# Altium footprint library con-amp.PCBLIB: 295 footprints (part 15 of 19)
Each footprint in its own frame and in the unit in brackets; x right, y up, seen from the top. Pads: shape width x height; smd on the part's side, far side on the other; paste and mask are expansions set on the pad; w line width, h text height; cw(c..) or ccw(c..) is an arc to the next point about the centre after c.
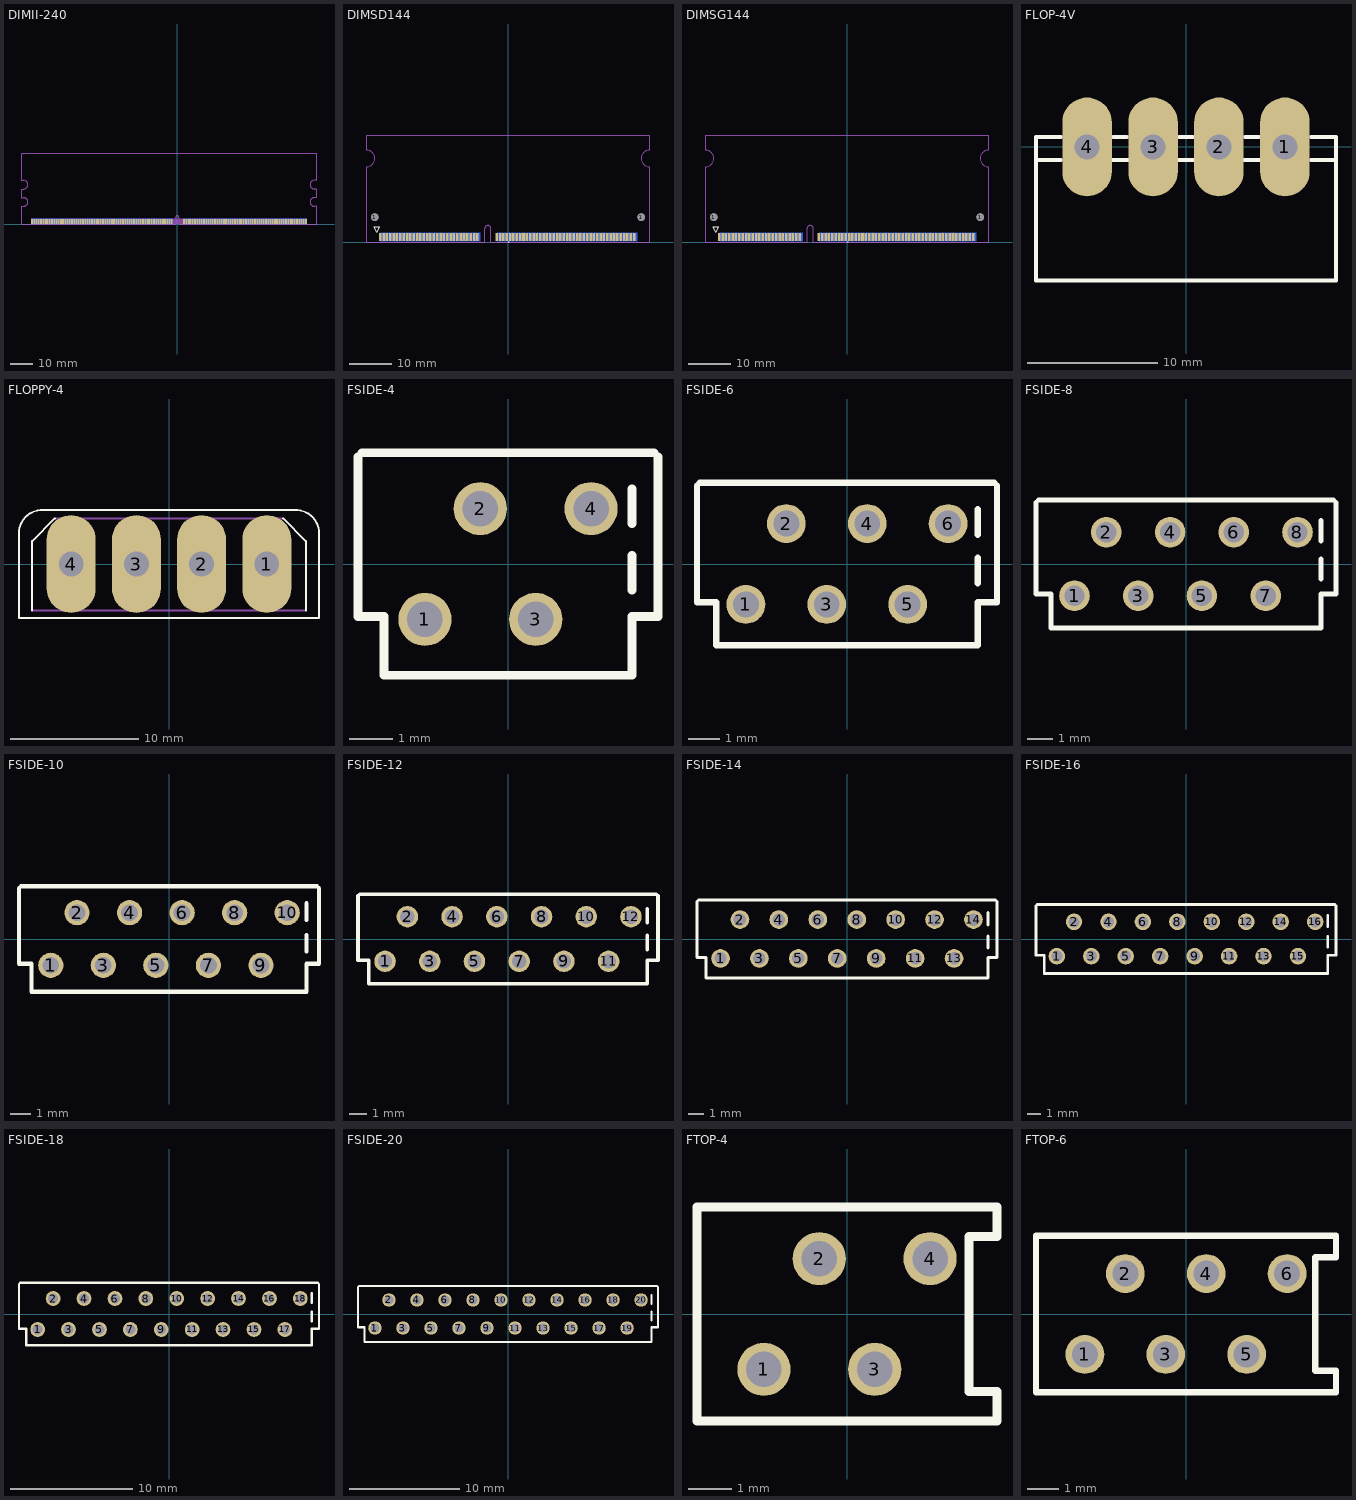
[diagram p14: the footprints below, top view; thin cyan lines are the x and y axes]

## DIMII-240 [mil]
pads (240):
  rect 31.5x90.55 smd: 1(-2578.74,49.21) 2(-2539.37,49.21) 3(-2500,49.21) 4(-2460.63,49.21) 5(-2421.26,49.21) 6(-2381.89,49.21) 7(-2342.52,49.21) 8(-2303.15,49.21) 9(-2263.78,49.21) 10(-2224.41,49.21) 11(-2185.04,49.21) 12(-2145.67,49.21) 13(-2106.3,49.21) 14(-2066.93,49.21) 15(-2027.56,49.21) 16(-1988.19,49.21) 17(-1948.82,49.21) 18(-1909.45,49.21) 19(-1870.08,49.21) 20(-1830.71,49.21) 21(-1791.34,49.21) 22(-1751.97,49.21) 23(-1712.6,49.21) 24(-1673.23,49.21) 25(-1633.86,49.21) 26(-1594.49,49.21) 27(-1555.12,49.21) 28(-1515.75,49.21) 29(-1476.38,49.21) 30(-1437.01,49.21) 31(-1397.64,49.21) 32(-1358.27,49.21) 33(-1318.9,49.21) 34(-1279.53,49.21) 35(-1240.16,49.21) 36(-1200.79,49.21) 37(-1161.42,49.21) 38(-1122.05,49.21) 39(-1082.68,49.21) 40(-1043.31,49.21) 41(-1003.94,49.21) 42(-964.57,49.21) 43(-925.2,49.21) 44(-885.83,49.21) 45(-846.46,49.21) 46(-807.09,49.21) 47(-767.72,49.21) 48(-728.35,49.21) 49(-688.98,49.21) 50(-649.61,49.21) 51(-610.24,49.21) 52(-570.87,49.21) 53(-531.5,49.21) 54(-492.13,49.21) 55(-452.76,49.21) 56(-413.39,49.21) 57(-374.02,49.21) 58(-334.65,49.21) 59(-295.28,49.21) 60(-255.91,49.21) 61(-216.54,49.21) 62(-177.17,49.21) 63(-137.8,49.21) 64(-98.43,49.21) 65(118.11,49.21) 66(157.48,49.21) 67(196.85,49.21) 68(236.22,49.21) 69(275.59,49.21) 70(314.96,49.21) 71(354.33,49.21) 72(393.7,49.21) 73(433.07,49.21) 74(472.44,49.21) 75(511.81,49.21) 76(551.18,49.21) 77(590.55,49.21) 78(629.92,49.21) 79(669.29,49.21) 80(708.66,49.21) 81(748.03,49.21) 82(787.4,49.21) 83(826.77,49.21) 84(866.14,49.21) 85(905.51,49.21) 86(944.88,49.21) 87(984.25,49.21) 88(1023.62,49.21) 89(1062.99,49.21) 90(1102.36,49.21) 91(1141.73,49.21) 92(1181.1,49.21) 93(1220.47,49.21) 94(1259.84,49.21) 95(1299.21,49.21) 96(1338.58,49.21) 97(1377.95,49.21) 98(1417.32,49.21) 99(1456.69,49.21) 100(1496.06,49.21) 101(1535.43,49.21) 102(1574.8,49.21) 103(1614.17,49.21) 104(1653.54,49.21) 105(1692.91,49.21) 106(1732.28,49.21) 107(1771.65,49.21) 108(1811.02,49.21) 109(1850.39,49.21) 110(1889.76,49.21) 111(1929.13,49.21) 112(1968.5,49.21) 113(2007.87,49.21) 114(2047.24,49.21) 115(2086.61,49.21) 116(2125.98,49.21) 117(2165.35,49.21) 118(2204.72,49.21) 119(2244.09,49.21) 120(2283.46,49.21)
  rect 31.5x90.55 smd far side: 121(-2578.74,49.21) 122(-2539.37,49.21) 123(-2500,49.21) 124(-2460.63,49.21) 125(-2421.26,49.21) 126(-2381.89,49.21) 127(-2342.52,49.21) 128(-2303.15,49.21) 129(-2263.78,49.21) 130(-2224.41,49.21) 131(-2185.04,49.21) 132(-2145.67,49.21) 133(-2106.3,49.21) 134(-2066.93,49.21) 135(-2027.56,49.21) 136(-1988.19,49.21) 137(-1948.82,49.21) 138(-1909.45,49.21) 139(-1870.08,49.21) 140(-1830.71,49.21) 141(-1791.34,49.21) 142(-1751.97,49.21) 143(-1712.6,49.21) 144(-1673.23,49.21) 145(-1633.86,49.21) 146(-1594.49,49.21) 147(-1555.12,49.21) 148(-1515.75,49.21) 149(-1476.38,49.21) 150(-1437.01,49.21) 151(-1397.64,49.21) 152(-1358.27,49.21) 153(-1318.9,49.21) 154(-1279.53,49.21) 155(-1240.16,49.21) 156(-1200.79,49.21) 157(-1161.42,49.21) 158(-1122.05,49.21) 159(-1082.68,49.21) 160(-1043.31,49.21) 161(-1003.94,49.21) 162(-964.57,49.21) 163(-925.2,49.21) 164(-885.83,49.21) 165(-846.46,49.21) 166(-807.09,49.21) 167(-767.72,49.21) 168(-728.35,49.21) 169(-688.98,49.21) 170(-649.61,49.21) 171(-610.24,49.21) 172(-570.87,49.21) 173(-531.5,49.21) 174(-492.13,49.21) 175(-452.76,49.21) 176(-413.39,49.21) 177(-374.02,49.21) 178(-334.65,49.21) 179(-295.28,49.21) 180(-255.91,49.21) 181(-216.54,49.21) 182(-177.17,49.21) 183(-137.8,49.21) 184(-98.43,49.21) 185(118.11,49.21) 186(157.48,49.21) 187(196.85,49.21) 188(236.22,49.21) 189(275.59,49.21) 190(314.96,49.21) 191(354.33,49.21) 192(393.7,49.21) 193(433.07,49.21) 194(472.44,49.21) 195(511.81,49.21) 196(551.18,49.21) 197(590.55,49.21) 198(629.92,49.21) 199(669.29,49.21) 200(708.66,49.21) 201(748.03,49.21) 202(787.4,49.21) 203(826.77,49.21) 204(866.14,49.21) 205(905.51,49.21) 206(944.88,49.21) 207(984.25,49.21) 208(1023.62,49.21) 209(1062.99,49.21) 210(1102.36,49.21) 211(1141.73,49.21) 212(1181.1,49.21) 213(1220.47,49.21) 214(1259.84,49.21) 215(1299.21,49.21) 216(1338.58,49.21) 217(1377.95,49.21) 218(1417.32,49.21) 219(1456.69,49.21) 220(1496.06,49.21) 221(1535.43,49.21) 222(1574.8,49.21) 223(1614.17,49.21) 224(1653.54,49.21) 225(1692.91,49.21) 226(1732.28,49.21) 227(1771.65,49.21) 228(1811.02,49.21) 229(1850.39,49.21) 230(1889.76,49.21) 231(1929.13,49.21) 232(1968.5,49.21) 233(2007.87,49.21) 234(2047.24,49.21) 235(2086.61,49.21) 236(2125.98,49.21) 237(2165.35,49.21) 238(2204.72,49.21) 239(2244.09,49.21) 240(2283.46,49.21)
Top Solder:
  rectangle: -2596.46,-2.95 -2561.02,96.46
  rectangle: -2557.09,-2.95 -2521.65,96.46
  rectangle: -2517.72,-2.95 -2482.28,96.46
  rectangle: -2478.35,-2.95 -2442.91,96.46
  rectangle: -2438.98,-2.95 -2403.54,96.46
  rectangle: -2399.61,-2.95 -2364.17,96.46
  rectangle: -2360.24,-2.95 -2324.8,96.46
  rectangle: -2320.87,-2.95 -2285.43,96.46
  rectangle: -2281.5,-2.95 -2246.06,96.46
  rectangle: -2242.13,-2.95 -2206.69,96.46
  rectangle: -2202.76,-2.95 -2167.32,96.46
  rectangle: -2163.39,-2.95 -2127.95,96.46
  rectangle: -2124.02,-2.95 -2088.58,96.46
  rectangle: -2084.65,-2.95 -2049.21,96.46
  rectangle: -2045.28,-2.95 -2009.84,96.46
  rectangle: -2005.91,-2.95 -1970.47,96.46
  rectangle: -1966.54,-2.95 -1931.1,96.46
  rectangle: -1927.17,-2.95 -1891.73,96.46
  rectangle: -1887.8,-2.95 -1852.36,96.46
  rectangle: -1848.43,-2.95 -1812.99,96.46
  rectangle: -1809.06,-2.95 -1773.62,96.46
  rectangle: -1769.69,-2.95 -1734.25,96.46
  rectangle: -1730.32,-2.95 -1694.88,96.46
  rectangle: -1690.94,-2.95 -1655.51,96.46
  rectangle: -1651.57,-2.95 -1616.14,96.46
  rectangle: -1612.2,-2.95 -1576.77,96.46
  rectangle: -1572.83,-2.95 -1537.4,96.46
  rectangle: -1533.46,-2.95 -1498.03,96.46
  rectangle: -1494.09,-2.95 -1458.66,96.46
  rectangle: -1454.72,-2.95 -1419.29,96.46
  rectangle: -1415.35,-2.95 -1379.92,96.46
  rectangle: -1375.98,-2.95 -1340.55,96.46
  rectangle: -1336.61,-2.95 -1301.18,96.46
  rectangle: -1297.24,-2.95 -1261.81,96.46
  rectangle: -1257.87,-2.95 -1222.44,96.46
  rectangle: -1218.5,-2.95 -1183.07,96.46
  rectangle: -1179.13,-2.95 -1143.7,96.46
  rectangle: -1139.76,-2.95 -1104.33,96.46
  rectangle: -1100.39,-2.95 -1064.96,96.46
  rectangle: -1061.02,-2.95 -1025.59,96.46
  rectangle: -1021.65,-2.95 -986.22,96.46
  rectangle: -982.28,-2.95 -946.85,96.46
  rectangle: -942.91,-2.95 -907.48,96.46
  rectangle: -903.54,-2.95 -868.11,96.46
  rectangle: -864.17,-2.95 -828.74,96.46
  rectangle: -824.8,-2.95 -789.37,96.46
  rectangle: -785.43,-2.95 -750,96.46
  rectangle: -746.06,-2.95 -710.63,96.46
  rectangle: -706.69,-2.95 -671.26,96.46
  rectangle: -667.32,-2.95 -631.89,96.46
  rectangle: -627.95,-2.95 -592.52,96.46
  rectangle: -588.58,-2.95 -553.15,96.46
  rectangle: -549.21,-2.95 -513.78,96.46
  rectangle: -509.84,-2.95 -474.41,96.46
  rectangle: -470.47,-2.95 -435.04,96.46
  rectangle: -431.1,-2.95 -395.67,96.46
  rectangle: -391.73,-2.95 -356.3,96.46
  rectangle: -352.36,-2.95 -316.93,96.46
  rectangle: -312.99,-2.95 -277.56,96.46
  rectangle: -273.62,-2.95 -238.19,96.46
  rectangle: -234.25,-2.95 -198.82,96.46
  rectangle: -194.88,-2.95 -159.45,96.46
  rectangle: -155.51,-2.95 -120.08,96.46
  rectangle: -116.14,-2.95 -80.71,96.46
  rectangle: 100.39,-2.95 135.83,96.46
  rectangle: 139.76,-2.95 175.2,96.46
  rectangle: 179.13,-2.95 214.57,96.46
  rectangle: 218.5,-2.95 253.94,96.46
  rectangle: 257.87,-2.95 293.31,96.46
  rectangle: 297.24,-2.95 332.68,96.46
  rectangle: 336.61,-2.95 372.05,96.46
  rectangle: 375.98,-2.95 411.42,96.46
  rectangle: 415.35,-2.95 450.79,96.46
  rectangle: 454.72,-2.95 490.16,96.46
  rectangle: 494.09,-2.95 529.53,96.46
  rectangle: 533.46,-2.95 568.9,96.46
  rectangle: 572.83,-2.95 608.27,96.46
  rectangle: 612.2,-2.95 647.64,96.46
  rectangle: 651.57,-2.95 687.01,96.46
  rectangle: 690.94,-2.95 726.38,96.46
  rectangle: 730.32,-2.95 765.75,96.46
  rectangle: 769.69,-2.95 805.12,96.46
  rectangle: 809.06,-2.95 844.49,96.46
  rectangle: 848.43,-2.95 883.86,96.46
  rectangle: 887.8,-2.95 923.23,96.46
  rectangle: 927.17,-2.95 962.6,96.46
  rectangle: 966.54,-2.95 1001.97,96.46
  rectangle: 1005.91,-2.95 1041.34,96.46
  rectangle: 1045.28,-2.95 1080.71,96.46
  rectangle: 1084.65,-2.95 1120.08,96.46
  rectangle: 1124.02,-2.95 1159.45,96.46
  rectangle: 1163.39,-2.95 1198.82,96.46
  rectangle: 1202.76,-2.95 1238.19,96.46
  rectangle: 1242.13,-2.95 1277.56,96.46
  rectangle: 1281.5,-2.95 1316.93,96.46
  rectangle: 1320.87,-2.95 1356.3,96.46
  rectangle: 1360.24,-2.95 1395.67,96.46
  rectangle: 1399.61,-2.95 1435.04,96.46
  rectangle: 1438.98,-2.95 1474.41,96.46
  rectangle: 1478.35,-2.95 1513.78,96.46
  rectangle: 1517.72,-2.95 1553.15,96.46
  rectangle: 1557.09,-2.95 1592.52,96.46
  rectangle: 1596.46,-2.95 1631.89,96.46
  rectangle: 1635.83,-2.95 1671.26,96.46
  rectangle: 1675.2,-2.95 1710.63,96.46
  rectangle: 1714.57,-2.95 1750,96.46
  rectangle: 1753.94,-2.95 1789.37,96.46
  rectangle: 1793.31,-2.95 1828.74,96.46
  rectangle: 1832.68,-2.95 1868.11,96.46
  rectangle: 1872.05,-2.95 1907.48,96.46
  rectangle: 1911.42,-2.95 1946.85,96.46
  rectangle: 1950.79,-2.95 1986.22,96.46
  rectangle: 1990.16,-2.95 2025.59,96.46
  rectangle: 2029.53,-2.95 2064.96,96.46
  rectangle: 2068.9,-2.95 2104.33,96.46
  rectangle: 2108.27,-2.95 2143.7,96.46
  rectangle: 2147.64,-2.95 2183.07,96.46
  rectangle: 2187.01,-2.95 2222.44,96.46
  rectangle: 2226.38,-2.95 2261.81,96.46
  rectangle: 2265.75,-2.95 2301.18,96.46
Bottom Solder:
  rectangle: -2596.46,-2.95 -2561.02,96.46
  rectangle: -2557.09,-2.95 -2521.65,96.46
  rectangle: -2517.72,-2.95 -2482.28,96.46
  rectangle: -2478.35,-2.95 -2442.91,96.46
  rectangle: -2438.98,-2.95 -2403.54,96.46
  rectangle: -2399.61,-2.95 -2364.17,96.46
  rectangle: -2360.24,-2.95 -2324.8,96.46
  rectangle: -2320.87,-2.95 -2285.43,96.46
  rectangle: -2281.5,-2.95 -2246.06,96.46
  rectangle: -2242.13,-2.95 -2206.69,96.46
  rectangle: -2202.76,-2.95 -2167.32,96.46
  rectangle: -2163.39,-2.95 -2127.95,96.46
  rectangle: -2124.02,-2.95 -2088.58,96.46
  rectangle: -2084.65,-2.95 -2049.21,96.46
  rectangle: -2045.28,-2.95 -2009.84,96.46
  rectangle: -2005.91,-2.95 -1970.47,96.46
  rectangle: -1966.54,-2.95 -1931.1,96.46
  rectangle: -1927.17,-2.95 -1891.73,96.46
  rectangle: -1887.8,-2.95 -1852.36,96.46
  rectangle: -1848.43,-2.95 -1812.99,96.46
  rectangle: -1809.06,-2.95 -1773.62,96.46
  rectangle: -1769.69,-2.95 -1734.25,96.46
  rectangle: -1730.32,-2.95 -1694.88,96.46
  rectangle: -1690.94,-2.95 -1655.51,96.46
  rectangle: -1651.57,-2.95 -1616.14,96.46
  rectangle: -1612.2,-2.95 -1576.77,96.46
  rectangle: -1572.83,-2.95 -1537.4,96.46
  rectangle: -1533.46,-2.95 -1498.03,96.46
  rectangle: -1494.09,-2.95 -1458.66,96.46
  rectangle: -1454.72,-2.95 -1419.29,96.46
  rectangle: -1415.35,-2.95 -1379.92,96.46
  rectangle: -1375.98,-2.95 -1340.55,96.46
  rectangle: -1336.61,-2.95 -1301.18,96.46
  rectangle: -1297.24,-2.95 -1261.81,96.46
  rectangle: -1257.87,-2.95 -1222.44,96.46
  rectangle: -1218.5,-2.95 -1183.07,96.46
  rectangle: -1179.13,-2.95 -1143.7,96.46
  rectangle: -1139.76,-2.95 -1104.33,96.46
  rectangle: -1100.39,-2.95 -1064.96,96.46
  rectangle: -1061.02,-2.95 -1025.59,96.46
  rectangle: -1021.65,-2.95 -986.22,96.46
  rectangle: -982.28,-2.95 -946.85,96.46
  rectangle: -942.91,-2.95 -907.48,96.46
  rectangle: -903.54,-2.95 -868.11,96.46
  rectangle: -864.17,-2.95 -828.74,96.46
  rectangle: -824.8,-2.95 -789.37,96.46
  rectangle: -785.43,-2.95 -750,96.46
  rectangle: -746.06,-2.95 -710.63,96.46
  rectangle: -706.69,-2.95 -671.26,96.46
  rectangle: -667.32,-2.95 -631.89,96.46
  rectangle: -627.95,-2.95 -592.52,96.46
  rectangle: -588.58,-2.95 -553.15,96.46
  rectangle: -549.21,-2.95 -513.78,96.46
  rectangle: -509.84,-2.95 -474.41,96.46
  rectangle: -470.47,-2.95 -435.04,96.46
  rectangle: -431.1,-2.95 -395.67,96.46
  rectangle: -391.73,-2.95 -356.3,96.46
  rectangle: -352.36,-2.95 -316.93,96.46
  rectangle: -312.99,-2.95 -277.56,96.46
  rectangle: -273.62,-2.95 -238.19,96.46
  rectangle: -234.25,-2.95 -198.82,96.46
  rectangle: -194.88,-2.95 -159.45,96.46
  rectangle: -155.51,-2.95 -120.08,96.46
  rectangle: -116.14,-2.95 -80.71,96.46
  rectangle: 100.39,-2.95 135.83,96.46
  rectangle: 139.76,-2.95 175.2,96.46
  rectangle: 179.13,-2.95 214.57,96.46
  rectangle: 218.5,-2.95 253.94,96.46
  rectangle: 257.87,-2.95 293.31,96.46
  rectangle: 297.24,-2.95 332.68,96.46
  rectangle: 336.61,-2.95 372.05,96.46
  rectangle: 375.98,-2.95 411.42,96.46
  rectangle: 415.35,-2.95 450.79,96.46
  rectangle: 454.72,-2.95 490.16,96.46
  rectangle: 494.09,-2.95 529.53,96.46
  rectangle: 533.46,-2.95 568.9,96.46
  rectangle: 572.83,-2.95 608.27,96.46
  rectangle: 612.2,-2.95 647.64,96.46
  rectangle: 651.57,-2.95 687.01,96.46
  rectangle: 690.94,-2.95 726.38,96.46
  rectangle: 730.32,-2.95 765.75,96.46
  rectangle: 769.69,-2.95 805.12,96.46
  rectangle: 809.06,-2.95 844.49,96.46
  rectangle: 848.43,-2.95 883.86,96.46
  rectangle: 887.8,-2.95 923.23,96.46
  rectangle: 927.17,-2.95 962.6,96.46
  rectangle: 966.54,-2.95 1001.97,96.46
  rectangle: 1005.91,-2.95 1041.34,96.46
  rectangle: 1045.28,-2.95 1080.71,96.46
  rectangle: 1084.65,-2.95 1120.08,96.46
  rectangle: 1124.02,-2.95 1159.45,96.46
  rectangle: 1163.39,-2.95 1198.82,96.46
  rectangle: 1202.76,-2.95 1238.19,96.46
  rectangle: 1242.13,-2.95 1277.56,96.46
  rectangle: 1281.5,-2.95 1316.93,96.46
  rectangle: 1320.87,-2.95 1356.3,96.46
  rectangle: 1360.24,-2.95 1395.67,96.46
  rectangle: 1399.61,-2.95 1435.04,96.46
  rectangle: 1438.98,-2.95 1474.41,96.46
  rectangle: 1478.35,-2.95 1513.78,96.46
  rectangle: 1517.72,-2.95 1553.15,96.46
  rectangle: 1557.09,-2.95 1592.52,96.46
  rectangle: 1596.46,-2.95 1631.89,96.46
  rectangle: 1635.83,-2.95 1671.26,96.46
  rectangle: 1675.2,-2.95 1710.63,96.46
  rectangle: 1714.57,-2.95 1750,96.46
  rectangle: 1753.94,-2.95 1789.37,96.46
  rectangle: 1793.31,-2.95 1828.74,96.46
  rectangle: 1832.68,-2.95 1868.11,96.46
  rectangle: 1872.05,-2.95 1907.48,96.46
  rectangle: 1911.42,-2.95 1946.85,96.46
  rectangle: 1950.79,-2.95 1986.22,96.46
  rectangle: 1990.16,-2.95 2025.59,96.46
  rectangle: 2029.53,-2.95 2064.96,96.46
  rectangle: 2068.9,-2.95 2104.33,96.46
  rectangle: 2108.27,-2.95 2143.7,96.46
  rectangle: 2147.64,-2.95 2183.07,96.46
  rectangle: 2187.01,-2.95 2222.44,96.46
  rectangle: 2226.38,-2.95 2261.81,96.46
  rectangle: 2265.75,-2.95 2301.18,96.46
Mechanical 1:
  lines w0: -2772.64,0 -29.53,0 -29.53,117.13 cw(c0,117.13) 29.53,117.13 29.53,0 2477.36,0 2477.36,314.96 2437.01,314.96 cw(c2437.01,393.7) 2437.01,472.44 2477.36,472.44 2477.36,622.05 2437.01,622.05 cw(c2437.01,700.79) 2437.01,779.53 2477.36,779.53 2477.36,1250 -2772.64,1250 -2772.64,779.53 -2732.28,779.53 cw(c-2732.28,700.79) -2732.28,622.05 -2772.64,622.05 -2772.64,472.44 -2732.28,472.44 cw(c-2732.28,393.7) -2732.28,314.96 -2772.64,314.96 -2772.64,0
Mechanical 23:
  rectangle: -2598.43,0 2303.15,98.43
Mechanical 24:
  rectangle: -2598.43,0 2303.15,98.43

## DIMSD144 [mm]
pads (146):
  round 1.8 hole 1.8: 1(-31.8,6) 1(31.8,6)
  rect 0.6x2 smd: 1(-30.5,1.25) 2(-29.7,1.25) 3(-28.9,1.25) 4(-28.1,1.25) 5(-27.3,1.25) 6(-26.5,1.25) 7(-25.7,1.25) 8(-24.9,1.25) 9(-24.1,1.25) 10(-23.3,1.25) 11(-22.5,1.25) 12(-21.7,1.25) 13(-20.9,1.25) 14(-20.1,1.25) 15(-19.3,1.25) 16(-18.5,1.25) 17(-17.7,1.25) 18(-16.9,1.25) 19(-16.1,1.25) 20(-15.3,1.25) 21(-14.5,1.25) 22(-13.7,1.25) 23(-12.9,1.25) 24(-12.1,1.25) 25(-11.3,1.25) 26(-10.5,1.25) 27(-9.7,1.25) 28(-8.9,1.25) 29(-8.1,1.25) 30(-7.3,1.25) 31(-2.7,1.25) 32(-1.9,1.25) 33(-1.1,1.25) 34(-0.3,1.25) 35(0.5,1.25) 36(1.3,1.25) 37(2.1,1.25) 38(2.9,1.25) 39(3.7,1.25) 40(4.5,1.25) 41(5.3,1.25) 42(6.1,1.25) 43(6.9,1.25) 44(7.7,1.25) 45(8.5,1.25) 46(9.3,1.25) 47(10.1,1.25) 48(10.9,1.25) 49(11.7,1.25) 50(12.5,1.25) 51(13.3,1.25) 52(14.1,1.25) 53(14.9,1.25) 54(15.7,1.25) 55(16.5,1.25) 56(17.3,1.25) 57(18.1,1.25) 58(18.9,1.25) 59(19.7,1.25) 60(20.5,1.25) 61(21.3,1.25) 62(22.1,1.25) 63(22.9,1.25) 64(23.7,1.25) 65(24.5,1.25) 66(25.3,1.25) 67(26.1,1.25) 68(26.9,1.25) 69(27.7,1.25) 70(28.5,1.25) 71(29.3,1.25) 72(30.1,1.25)
  rect 0.6x2 smd far side: 73(-30.1,1.25) 74(-29.3,1.25) 75(-28.5,1.25) 76(-27.7,1.25) 77(-26.9,1.25) 78(-26.1,1.25) 79(-25.3,1.25) 80(-24.5,1.25) 81(-23.7,1.25) 82(-22.9,1.25) 83(-22.1,1.25) 84(-21.3,1.25) 85(-20.5,1.25) 86(-19.7,1.25) 87(-18.9,1.25) 88(-18.1,1.25) 89(-17.3,1.25) 90(-16.5,1.25) 91(-15.7,1.25) 92(-14.9,1.25) 93(-14.1,1.25) 94(-13.3,1.25) 95(-12.5,1.25) 96(-11.7,1.25) 97(-10.9,1.25) 98(-10.1,1.25) 99(-9.3,1.25) 100(-8.5,1.25) 101(-7.7,1.25) 102(-6.9,1.25) 103(-2.3,1.25) 104(-1.5,1.25) 105(-0.7,1.25) 106(0.1,1.25) 107(0.9,1.25) 108(1.7,1.25) 109(2.5,1.25) 110(3.3,1.25) 111(4.1,1.25) 112(4.9,1.25) 113(5.7,1.25) 114(6.5,1.25) 115(7.3,1.25) 116(8.1,1.25) 117(8.9,1.25) 118(9.7,1.25) 119(10.5,1.25) 120(11.3,1.25) 121(12.1,1.25) 122(12.9,1.25) 123(13.7,1.25) 124(14.5,1.25) 125(15.3,1.25) 126(16.1,1.25) 127(16.9,1.25) 128(17.7,1.25) 129(18.5,1.25) 130(19.3,1.25) 131(20.1,1.25) 132(20.9,1.25) 133(21.7,1.25) 134(22.5,1.25) 135(23.3,1.25) 136(24.1,1.25) 137(24.9,1.25) 138(25.7,1.25) 139(26.5,1.25) 140(27.3,1.25) 141(28.1,1.25) 142(28.9,1.25) 143(29.7,1.25) 144(30.5,1.25)
Top Overlay:
  region: 0,0 0.254,0 0.254,0.254 0,0.254
  lines w0.254: -31.9,3.7 -31.3,2.4 -30.7,3.7 -31.9,3.7
Mechanical 1:
  lines w0: -33.8,0 -5.5,0 -5.5,3.3 cw(c-4.8,3.3) -4.1,3.3 -4.1,0 33.8,0 33.8,18 cw(c33.8,20) 33.8,22 33.8,25.4 -33.8,25.4 -33.8,22 cw(c-33.8,20) -33.8,18 -33.8,0

## DIMSG144 [mm]
pads (146):
  round 1.8 hole 1.8: 1(-31.8,6) 1(31.8,6)
  rect 0.6x2 smd: 1(-30.5,1.25) 2(-29.7,1.25) 3(-28.9,1.25) 4(-28.1,1.25) 5(-27.3,1.25) 6(-26.5,1.25) 7(-25.7,1.25) 8(-24.9,1.25) 9(-24.1,1.25) 10(-23.3,1.25) 11(-22.5,1.25) 12(-21.7,1.25) 13(-20.9,1.25) 14(-20.1,1.25) 15(-19.3,1.25) 16(-18.5,1.25) 17(-17.7,1.25) 18(-16.9,1.25) 19(-16.1,1.25) 20(-15.3,1.25) 21(-14.5,1.25) 22(-13.7,1.25) 23(-12.9,1.25) 24(-12.1,1.25) 25(-11.3,1.25) 26(-6.7,1.25) 27(-5.9,1.25) 28(-5.1,1.25) 29(-4.3,1.25) 30(-3.5,1.25) 31(-2.7,1.25) 32(-1.9,1.25) 33(-1.1,1.25) 34(-0.3,1.25) 35(0.5,1.25) 36(1.3,1.25) 37(2.1,1.25) 38(2.9,1.25) 39(3.7,1.25) 40(4.5,1.25) 41(5.3,1.25) 42(6.1,1.25) 43(6.9,1.25) 44(7.7,1.25) 45(8.5,1.25) 46(9.3,1.25) 47(10.1,1.25) 48(10.9,1.25) 49(11.7,1.25) 50(12.5,1.25) 51(13.3,1.25) 52(14.1,1.25) 53(14.9,1.25) 54(15.7,1.25) 55(16.5,1.25) 56(17.3,1.25) 57(18.1,1.25) 58(18.9,1.25) 59(19.7,1.25) 60(20.5,1.25) 61(21.3,1.25) 62(22.1,1.25) 63(22.9,1.25) 64(23.7,1.25) 65(24.5,1.25) 66(25.3,1.25) 67(26.1,1.25) 68(26.9,1.25) 69(27.7,1.25) 70(28.5,1.25) 71(29.3,1.25) 72(30.1,1.25)
  rect 0.6x2 smd far side: 73(-30.1,1.25) 74(-29.3,1.25) 75(-28.5,1.25) 76(-27.7,1.25) 77(-26.9,1.25) 78(-26.1,1.25) 79(-25.3,1.25) 80(-24.5,1.25) 81(-23.7,1.25) 82(-22.9,1.25) 83(-22.1,1.25) 84(-21.3,1.25) 85(-20.5,1.25) 86(-19.7,1.25) 87(-18.9,1.25) 88(-18.1,1.25) 89(-17.3,1.25) 90(-16.5,1.25) 91(-15.7,1.25) 92(-14.9,1.25) 93(-14.1,1.25) 94(-13.3,1.25) 95(-12.5,1.25) 96(-11.7,1.25) 97(-10.9,1.25) 98(-6.3,1.25) 99(-5.5,1.25) 100(-4.7,1.25) 101(-3.9,1.25) 102(-3.1,1.25) 103(-2.3,1.25) 104(-1.5,1.25) 105(-0.7,1.25) 106(0.1,1.25) 107(0.9,1.25) 108(1.7,1.25) 109(2.5,1.25) 110(3.3,1.25) 111(4.1,1.25) 112(4.9,1.25) 113(5.7,1.25) 114(6.5,1.25) 115(7.3,1.25) 116(8.1,1.25) 117(8.9,1.25) 118(9.7,1.25) 119(10.5,1.25) 120(11.3,1.25) 121(12.1,1.25) 122(12.9,1.25) 123(13.7,1.25) 124(14.5,1.25) 125(15.3,1.25) 126(16.1,1.25) 127(16.9,1.25) 128(17.7,1.25) 129(18.5,1.25) 130(19.3,1.25) 131(20.1,1.25) 132(20.9,1.25) 133(21.7,1.25) 134(22.5,1.25) 135(23.3,1.25) 136(24.1,1.25) 137(24.9,1.25) 138(25.7,1.25) 139(26.5,1.25) 140(27.3,1.25) 141(28.1,1.25) 142(28.9,1.25) 143(29.7,1.25) 144(30.5,1.25)
Top Overlay:
  region: 0,0 0.254,0 0.254,0.254 0,0.254
  lines w0.254: -31.9,3.7 -31.3,2.4 -30.7,3.7 -31.9,3.7
Mechanical 1:
  lines w0: -33.8,0 -9.5,0 -9.5,3.3 cw(c-8.8,3.3) -8.1,3.3 -8.1,0 33.8,0 33.8,18 cw(c33.8,20) 33.8,22 33.8,25.4 -33.8,25.4 -33.8,22 cw(c-33.8,20) -33.8,18 -33.8,0

## FLOP-4V [mil]
pads (4):
  oval 150x300 hole 76: 1(300,0) 2(100,0) 3(-100,0) 4(-300,0)
Top Overlay:
  lines w12: -450,-40 -380,-40 ; -380,30 -455,30 -455,-405 455,-405 455,-40 ; -225,-40 -175,-40 ; -220,30 -180,30 ; -25,-40 25,-40 ; -20,30 20,30 ; 175,-40 225,-40 ; 180,30 220,30 ; 380,-40 455,-40 ; 380,30 455,30 455,-40
Mechanical 16:
  lines w12: -380,-40 -225,-40 ; -380,30 -220,30 ; -180,30 -20,30 ; -175,-40 -25,-40 ; 20,30 180,30 ; 25,-40 175,-40 ; 220,30 380,30 ; 225,-40 380,-40

## FLOPPY-4 [mil]
pads (4):
  oval 150x300 hole 76: 1(300,0) 2(100,0) 3(-100,0) 4(-300,0)
Top Overlay:
  lines w6: -420,-142 -420,70 -350,140 ; 350,140 420,70 420,-142 ; -460,-165 460,-165 460,95 ccw(c389.82,95) 385,165 -385,165 ccw(c-389.82,95) -460,95 -460,-165
Mechanical 16:
  lines w6: -420,-142 420,-142 ; -350,140 350,140

## FSIDE-4 [mil]
pads (4):
  round 48 hole 32: 1(-75,-50) 2(-25,50) 3(25,-50) 4(75,50)
Top Overlay:
  lines w8: -135.43,96.5 -135.43,-47.24 -111.81,-47.24 -111.81,-100.39 111.81,-100.39 111.81,-47.24 135.43,-47.24 135.43,96.5 ; -131.81,100.39 131.81,100.39 ; 111.81,-23.62 111.81,7.87 ; 111.81,36.38 111.81,67.87

## FSIDE-6 [mil]
pads (6):
  round 48 hole 32: 1(-125,-50) 2(-75,50) 3(-25,-50) 4(25,50) 5(75,-50) 6(125,50)
Top Overlay:
  lines w8: -185.43,96.5 -185.43,-47.24 -161.81,-47.24 -161.81,-100.39 161.81,-100.39 161.81,-47.24 185.43,-47.24 185.43,96.5 ; -181.81,100.39 181.81,100.39 ; 161.81,-23.62 161.81,7.87 ; 161.81,36.38 161.81,67.87

## FSIDE-8 [mil]
pads (8):
  round 48 hole 32: 1(-175,-50) 2(-125,50) 3(-75,-50) 4(-25,50) 5(25,-50) 6(75,50) 7(125,-50) 8(175,50)
Top Overlay:
  lines w8: -235.43,96.5 -235.43,-47.24 -211.81,-47.24 -211.81,-100.39 211.81,-100.39 211.81,-47.24 235.43,-47.24 235.43,96.5 ; -231.81,100.39 231.81,100.39 ; 211.81,-23.62 211.81,7.87 ; 211.81,36.38 211.81,67.87

## FSIDE-10 [mil]
pads (10):
  round 48 hole 32: 1(-225,-50) 2(-175,50) 3(-125,-50) 4(-75,50) 5(-25,-50) 6(25,50) 7(75,-50) 8(125,50) 9(175,-50) 10(225,50)
Top Overlay:
  lines w8: -285.43,96.5 -285.43,-47.24 -261.81,-47.24 -261.81,-100.39 261.81,-100.39 261.81,-47.24 285.43,-47.24 285.43,96.5 ; -281.81,100.39 281.81,100.39 ; 261.81,-23.62 261.81,7.87 ; 261.81,36.38 261.81,67.87

## FSIDE-12 [mil]
pads (12):
  round 48 hole 32: 1(-275,-50) 2(-225,50) 3(-175,-50) 4(-125,50) 5(-75,-50) 6(-25,50) 7(25,-50) 8(75,50) 9(125,-50) 10(175,50) 11(225,-50) 12(275,50)
Top Overlay:
  lines w8: -335.43,96.5 -335.43,-47.24 -311.81,-47.24 -311.81,-100.39 311.81,-100.39 311.81,-47.24 335.43,-47.24 335.43,96.5 ; -331.81,100.39 331.81,100.39 ; 311.81,-23.62 311.81,7.87 ; 311.81,36.38 311.81,67.87

## FSIDE-14 [mil]
pads (14):
  round 48 hole 32: 1(-325,-50) 2(-275,50) 3(-225,-50) 4(-175,50) 5(-125,-50) 6(-75,50) 7(-25,-50) 8(25,50) 9(75,-50) 10(125,50) 11(175,-50) 12(225,50) 13(275,-50) 14(325,50)
Top Overlay:
  lines w8: -385.43,96.5 -385.43,-47.24 -361.81,-47.24 -361.81,-100.39 361.81,-100.39 361.81,-47.24 385.43,-47.24 385.43,96.5 ; -381.81,100.39 381.81,100.39 ; 361.81,-23.62 361.81,7.87 ; 361.81,36.38 361.81,67.87

## FSIDE-16 [mil]
pads (16):
  round 48 hole 32: 1(-375,-50) 2(-325,50) 3(-275,-50) 4(-225,50) 5(-175,-50) 6(-125,50) 7(-75,-50) 8(-25,50) 9(25,-50) 10(75,50) 11(125,-50) 12(175,50) 13(225,-50) 14(275,50) 15(325,-50) 16(375,50)
Top Overlay:
  lines w8: -435.43,96.5 -435.43,-47.24 -411.81,-47.24 -411.81,-100.39 411.81,-100.39 411.81,-47.24 435.43,-47.24 435.43,96.5 ; -431.81,100.39 431.81,100.39 ; 411.81,-23.62 411.81,7.87 ; 411.81,36.38 411.81,67.87

## FSIDE-18 [mil]
pads (18):
  round 48 hole 32: 1(-425,-50) 2(-375,50) 3(-325,-50) 4(-275,50) 5(-225,-50) 6(-175,50) 7(-125,-50) 8(-75,50) 9(-25,-50) 10(25,50) 11(75,-50) 12(125,50) 13(175,-50) 14(225,50) 15(275,-50) 16(325,50) 17(375,-50) 18(425,50)
Top Overlay:
  lines w8: -485.43,96.5 -485.43,-47.24 -461.81,-47.24 -461.81,-100.39 461.81,-100.39 461.81,-47.24 485.43,-47.24 485.43,96.5 ; -481.81,100.39 481.81,100.39 ; 461.81,-23.62 461.81,7.87 ; 461.81,36.38 461.81,67.87

## FSIDE-20 [mil]
pads (20):
  round 48 hole 32: 1(-475,-50) 2(-425,50) 3(-375,-50) 4(-325,50) 5(-275,-50) 6(-225,50) 7(-175,-50) 8(-125,50) 9(-75,-50) 10(-25,50) 11(25,-50) 12(75,50) 13(125,-50) 14(175,50) 15(225,-50) 16(275,50) 17(325,-50) 18(375,50) 19(425,-50) 20(475,50)
Top Overlay:
  lines w8: -535.43,96.5 -535.43,-47.24 -511.81,-47.24 -511.81,-100.39 511.81,-100.39 511.81,-47.24 535.43,-47.24 535.43,96.5 ; -531.81,100.39 531.81,100.39 ; 511.81,-23.62 511.81,7.87 ; 511.81,36.38 511.81,67.87

## FTOP-4 [mil]
pads (4):
  round 48 hole 32: 1(-75,-50) 2(-25,50) 3(25,-50) 4(75,50)
Top Overlay:
  lines w8: -135.43,-96.46 135.43,-96.46 135.43,-70 110,-70 110,70 135.43,70 135.43,96.46 -135.43,96.46 -135.43,-96.46

## FTOP-6 [mil]
pads (6):
  round 48 hole 32: 1(-125,-50) 2(-75,50) 3(-25,-50) 4(25,50) 5(75,-50) 6(125,50)
Top Overlay:
  lines w8: -185.43,-96.46 185.43,-96.46 185.43,-70 160,-70 160,70 185.43,70 185.43,96.46 -185.43,96.46 -185.43,-96.46